# Altium footprint library MODULE.PcbLib: 33 footprints (part 2 of 3)
Each footprint in its own frame and in the unit in brackets; x right, y up, seen from the top. Pads: shape width x height; smd on the part's side, far side on the other; paste and mask are expansions set on the pad; w line width, h text height; cw(c..) or ccw(c..) is an arc to the next point about the centre after c.
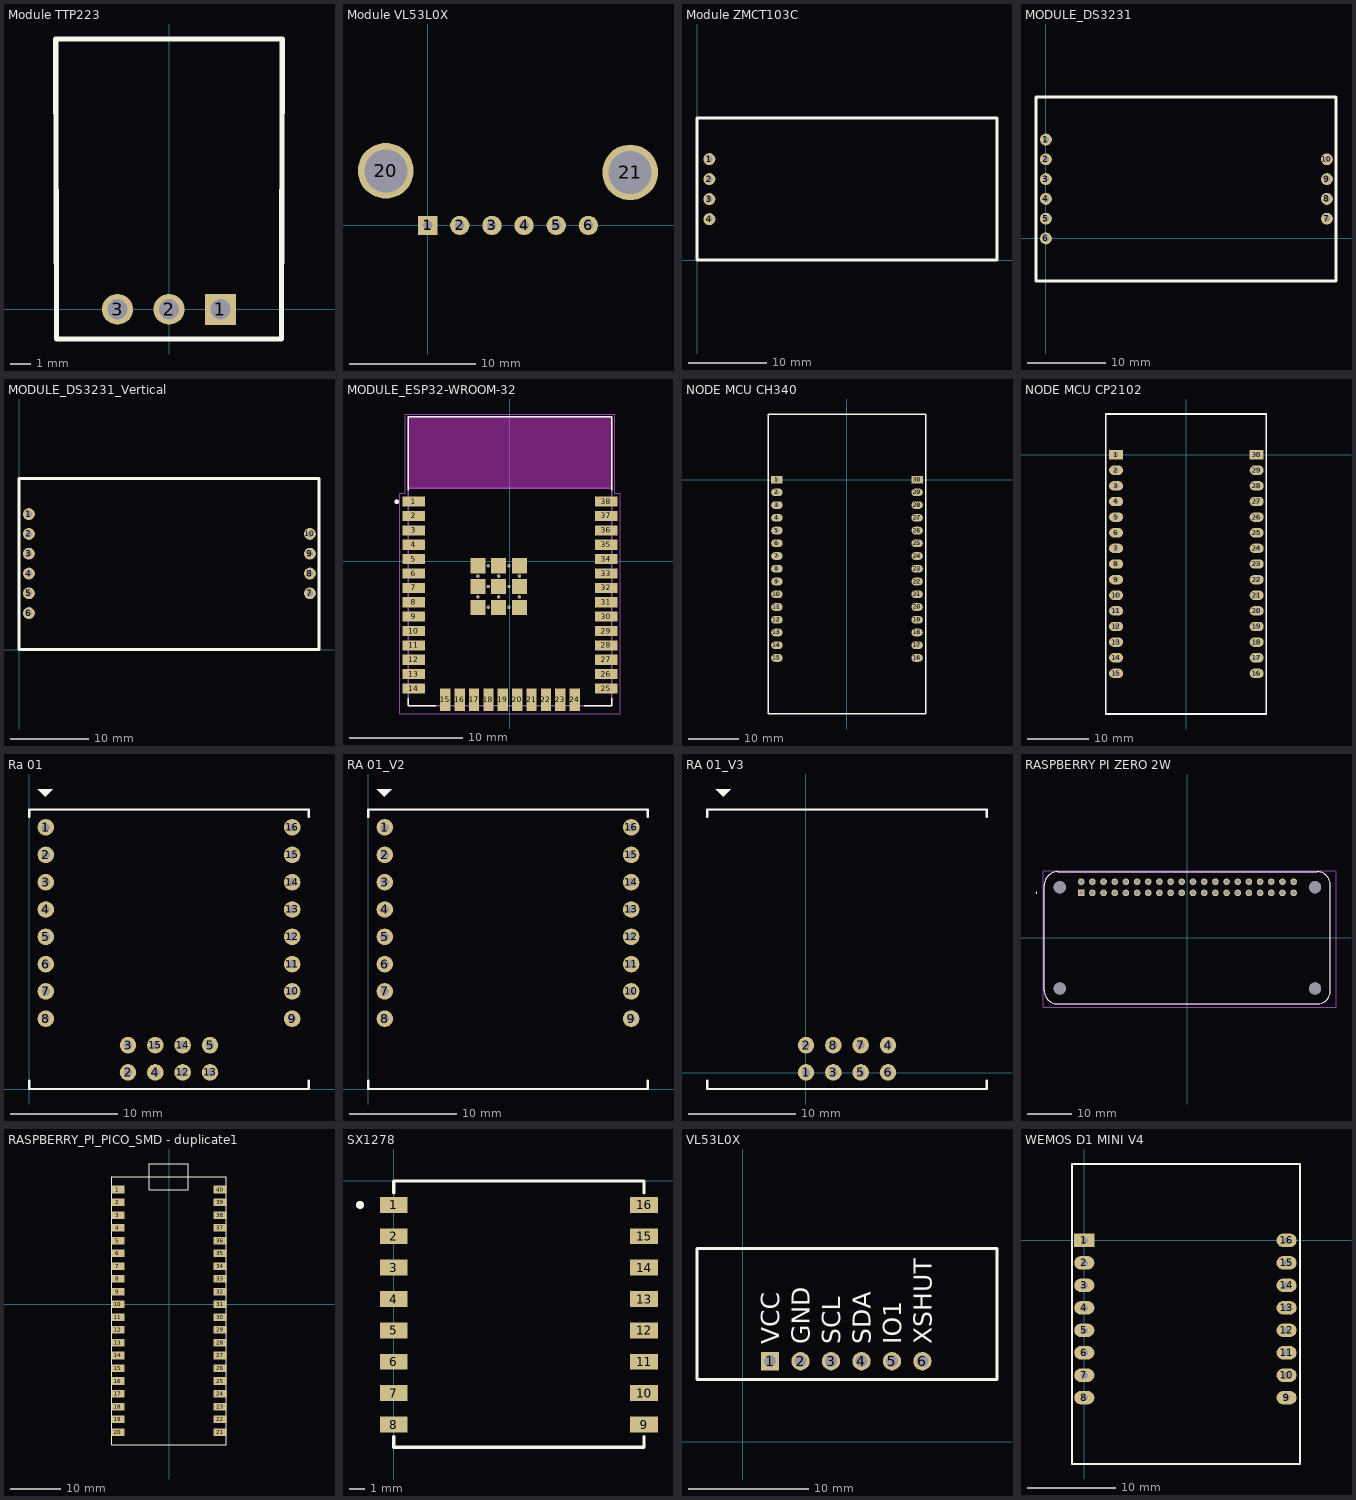
[diagram p1: the footprints below, top view; thin cyan lines are the x and y axes]

## Module TTP223 [mil]
pads (3):
  rect 60x60 hole 39.37: 1(100,0)
  round 60 hole 39.37: 2(0,0) 3(-100,0)
Top Overlay:
  lines w10: -220,525 220,525 218.23,-57.67 -218.23,-57.67 -220,525
3D body "touch button TTP223.SLDPRT": height 39.37, standoff -39.37, extent -206.69,-45.43 206.69,525.43

## Module VL53L0X [mil] "Module VL53L0X"
pads (8):
  rect 60x60 hole 30: 1(0,0)
  round 60 hole 30: 2(100,0) 3(200,0) 4(300,0) 5(400,0) 6(500,0)
  round 173.23 hole 133.86: 20(-130,170) 21(630,165)
3D body "VL53L0X_TOF.step": height 39.37, standoff -110.24, extent -245.58,-44.57 745.58,384.57

## Module ZMCT103C [mil] "Current Sensor 5A AC – 1 phaseplpl"
pads (4):
  round 60 hole 30: 1(60.63,504.33) 2(60.63,404.33) 3(60.63,304.33) 4(60.63,204.33)
Top Overlay:
  lines w15: -1.06,710 1495,710 ; 0,708.66 0,0 1495,0 ; 1496.06,0 1496.06,708.66
3D body "1x4.STEP": height 354.33, standoff -340.16, extent 10,155 110,555

## MODULE_DS3231 [mil]
pads (10):
  round 60 hole 30: 1(0,500) 2(0,400) 3(0,300) 4(0,200) 5(0,100) 6(0,0) 7(1420,100) 8(1420,200) 9(1420,300) 10(1420,400)
Top Overlay:
  lines w15: -50,-215 -50,715 1465.75,715 1465.75,-215 -50,-215
3D body "DS3231 RTC.step": height 1586.61, standoff -175.2, extent -12.2,-198.82 520.47,698.82

## MODULE_DS3231_Vertical [mil]
pads (10):
  round 60 hole 30: 1(50,685) 2(50,585) 3(50,485) 4(50,385) 5(50,285) 6(50,185) 7(1470,285) 8(1470,385) 9(1470,485) 10(1470,585)
Top Overlay:
  lines w15: 0,0 1515.75,0 1515.75,866.14 0,866.14 0,0
3D body "2.54 mm crooked Male Header Dupont Pins, 90°, 1X4 v1.step": height 168.11, standoff -122.83, extent 1167.32,235 1482.68,635
3D body "DS3231 RTC.step": height 1828.74, standoff 66.93, extent 919.53,-13.82 1452.2,883.82

## MODULE_ESP32-WROOM-32 [mm]
height 3.2
pads (59):
  rect 2x0.9 smd: 1(-8.5,5.26) 2(-8.5,3.99) 3(-8.5,2.72) 4(-8.5,1.45) 5(-8.5,0.18) 6(-8.5,-1.09) 7(-8.5,-2.36) 8(-8.5,-3.63) 9(-8.5,-4.9) 10(-8.5,-6.17) 11(-8.5,-7.44) 12(-8.5,-8.71) 13(-8.5,-9.98) 14(-8.5,-11.25) 25(8.5,-11.25) 26(8.5,-9.98) 27(8.5,-8.71) 28(8.5,-7.44) 29(8.5,-6.17) 30(8.5,-4.9) 31(8.5,-3.63) 32(8.5,-2.36) 33(8.5,-1.09) 34(8.5,0.18) 35(8.5,1.45) 36(8.5,2.72) 37(8.5,3.99) 38(8.5,5.26)
  rect 0.9x2 smd: 15(-5.715,-12.25) 16(-4.445,-12.25) 17(-3.175,-12.25) 18(-1.905,-12.25) 19(-0.635,-12.25) 20(0.635,-12.25) 21(1.905,-12.25) 22(3.175,-12.25) 23(4.445,-12.25) 24(5.715,-12.25)
  rect 1.33x1.33 smd: 39_1(-2.835,-0.405) 39_2(-1,-0.405) 39_3(0.835,-0.405) 39_4(-2.835,-2.24) 39_5(-1,-2.24) 39_6(0.835,-2.24) 39_7(-2.835,-4.075) 39_8(-1,-4.075) 39_9(0.835,-4.075)
  round 0.3 hole 0.2: 39_10(-1.917,-0.405) 39_11(-0.082,-0.405) 39_12(-2.835,-1.322) 39_13(-1,-1.322) 39_14(0.835,-1.322) 39_15(-1.917,-2.24) 39_16(-0.082,-2.24) 39_17(-2.835,-3.157) 39_18(-1,-3.157) 39_19(0.835,-3.157) 39_20(-1.917,-4.075) 39_21(-0.082,-4.075)
Top Overlay:
  circle w0.2: c-10,5.25 r0.1
  lines w0.127: -9,-12.1 -9,-12.75 -6.55,-12.75 ; -9,6.25 -9,12.75 9,12.75 9,6.25 ; 6.55,-12.75 9,-12.75 9,-12.1
Keep-Out Layer:
  region: 9,6.45 -9,6.45 -9,12.75 9,12.75
  region: 9,6.45 -9,6.45 -9,12.75 9,12.75
Mechanical 13:
  circle w0.2: c-10,5.25 r0.1
  lines w0.127: -9,6.45 -9,-12.75 9,-12.75 9,6.45 ; -9,6.45 -9,12.75 9,12.75 9,6.45 ; -9,6.45 9,6.45
  text "ANTENNA" at -6,9 h1.78
Mechanical 15:
  lines w0.05: -9.75,-13.5 9.75,-13.5 9.75,6 9.25,6 9.25,13 -9.25,13 -9.25,6 -9.75,6 -9.75,-13.5
3D body "step_temp.STEP": height 3.2, standoff 0, extent -9,-12.75 9,12.75

## NODE MCU CH340 [mil]
pads (30):
  rect 90x60 hole 31: 1(-550,0) 30(550,0)
  oval 90x60 hole 31: 2(-550,-100) 3(-550,-200) 4(-550,-300) 5(-550,-400) 6(-550,-500) 7(-550,-600) 8(-550,-700) 9(-550,-800) 10(-550,-900) 11(-550,-1000) 12(-550,-1100) 13(-550,-1200) 14(-550,-1300) 15(-550,-1400) 16(550,-1400) 17(550,-1300) 18(550,-1200) 19(550,-1100) 20(550,-1000) 21(550,-900) 22(550,-800) 23(550,-700) 24(550,-600) 25(550,-500) 26(550,-400) 27(550,-300) 28(550,-200) 29(550,-100)
Top Overlay:
  lines w10: -620,-1840 -620,515 620,515 620,-1840 -620,-1840
3D body "Lolin NodeMCU ESP8266 V3.STEP": height 299.21, standoff -218.11, extent -625,-1845.71 615.16,515.71

## NODE MCU CP2102 [mil]
pads (30):
  rect 90x60 hole 31: 1(-450,0) 30(450,0)
  oval 90x60 hole 31: 2(-450,-100) 3(-450,-200) 4(-450,-300) 5(-450,-400) 6(-450,-500) 7(-450,-600) 8(-450,-700) 9(-450,-800) 10(-450,-900) 11(-450,-1000) 12(-450,-1100) 13(-450,-1200) 14(-450,-1300) 15(-450,-1400) 16(450,-1400) 17(450,-1300) 18(450,-1200) 19(450,-1100) 20(450,-1000) 21(450,-900) 22(450,-800) 23(450,-700) 24(450,-600) 25(450,-500) 26(450,-400) 27(450,-300) 28(450,-200) 29(450,-100)
Top Overlay:
  lines w10: -515,-1660 510,-1660 510,260 -515,260 -515,-1660
3D body "+++ ESP8266 NodeMCU Board +++.stp": height 276.72, standoff -212.6, extent -505.71,-1655 505.71,253.86

## Ra 01 [mm] "SX1278 Lora Ra-01 AI-Thinker Mạch Thu Phát RF 433MHz 10Km-DIP"
pads (24):
  round 1.54 hole 0.752: 1(1.54,24.345) 2(1.54,21.78) 2(9.19,1.54) 3(1.54,19.24) 3(9.19,4.08) 4(1.54,16.7) 4(11.73,1.54) 5(1.54,14.16) 5(16.817,4.08) 6(1.54,11.62) 7(1.54,9.08) 8(1.54,6.54) 9(24.46,6.54) 10(24.46,9.08) 11(24.46,11.62) 12(14.277,1.54) 12(24.46,14.16) 13(16.817,1.54) 13(24.46,16.7) 14(14.277,4.08) 14(24.46,19.24) 15(11.73,4.08) 15(24.46,21.78) 16(24.469,24.345)
Top Overlay:
  region: 0.794,27.908 2.191,27.908 1.492,27.21
  lines w0.203: 0,0.762 0,0 26,0 26,0.762 ; 0,25.314 0,26 26,26 26,25.314
Bottom Solder:
  lines w0.127: 0,0 0,26 ; 26,0 26,26 ; 26.006,0 26.006,26
Mechanical 1:
  lines w0.127: 0,0 26,0 ; 0,26 26,26
3D body "zl262-8s_p2-54_l20-8_w2-54_h8-5.stp": height 8.5, standoff -3, extent 0.346,5.084 2.886,25.904
3D body "2x4 Femaile Header v2.step": height 7.5, standoff -3.75, extent 7.796,0.307 18.296,5.207
3D body "zl262-8s_p2-54_l20-8_w2-54_h8-5.stp": height 3, standoff -8.5, extent 23.206,5.084 25.746,25.904

## RA 01_V2 [mm]
pads (16):
  round 1.54 hole 0.752: 1(1.54,24.345) 2(1.54,21.78) 3(1.54,19.24) 4(1.54,16.7) 5(1.54,14.16) 6(1.54,11.62) 7(1.54,9.08) 8(1.54,6.54) 9(24.46,6.54) 10(24.46,9.08) 11(24.46,11.62) 12(24.46,14.16) 13(24.46,16.7) 14(24.46,19.24) 15(24.46,21.78) 16(24.469,24.345)
Top Overlay:
  region: 0.794,27.908 2.191,27.908 1.492,27.21
  lines w0.203: 0,0.762 0,0 26,0 26,0.762 ; 0,25.314 0,26 26,26 26,25.314
Bottom Solder:
  lines w0.127: 0,0 0,26 ; 26,0 26,26 ; 26.006,0 26.006,26
Mechanical 1:
  lines w0.127: 0,0 26,0 ; 0,26 26,26
3D body "zl262-8s_p2-54_l20-8_w2-54_h8-5.stp": height 3, standoff -8.5, extent 23.206,5.084 25.746,25.904
3D body "zl262-8s_p2-54_l20-8_w2-54_h8-5.stp": height 8.5, standoff -3, extent 0.346,5.084 2.886,25.904

## RA 01_V3 [mm]
pads (8):
  round 1.54 hole 0.752: 1(0.046,0.016) 2(0.046,2.556) 3(2.586,0.016) 4(7.673,2.556) 5(5.133,0.016) 6(7.673,0.016) 7(5.133,2.556) 8(2.586,2.556)
Top Overlay:
  region: -8.35,26.384 -6.953,26.384 -7.652,25.686
  lines w0.203: -9.144,-0.762 -9.144,-1.524 16.856,-1.524 16.856,-0.762 ; -9.144,23.79 -9.144,24.476 16.856,24.476 16.856,23.79
Bottom Solder:
  lines w0.127: -9.144,-1.524 -9.144,24.476 ; 16.856,-1.524 16.856,24.476 ; 16.862,-1.524 16.862,24.476
Mechanical 1:
  lines w0.127: -9.144,-1.524 16.856,-1.524 ; -9.144,24.476 16.856,24.476
3D body "2x4 Femaile Header v2.step": height 7.5, standoff -3.75, extent -1.348,-1.217 9.152,3.683

## RASPBERRY PI ZERO 2W [mm]
pads (44):
  rect 1.508x1.508 / inner round 1.508 / far side rect 1.508x1.508 hole 1: 1(-24.13,10.23)
  round 1.508 hole 1: 2(-24.13,12.77) 3(-21.59,10.23) 4(-21.59,12.77) 5(-19.05,10.23) 6(-19.05,12.77) 7(-16.51,10.23) 8(-16.51,12.77) 9(-13.97,10.23) 10(-13.97,12.77) 11(-11.43,10.23) 12(-11.43,12.77) 13(-8.89,10.23) 14(-8.89,12.77) 15(-6.35,10.23) 16(-6.35,12.77) 17(-3.81,10.23) 18(-3.81,12.77) 19(-1.27,10.23) 20(-1.27,12.77) 21(1.27,10.23) 22(1.27,12.77) 23(3.81,10.23) 24(3.81,12.77) 25(6.35,10.23) 26(6.35,12.77) 27(8.89,10.23) 28(8.89,12.77) 29(11.43,10.23) 30(11.43,12.77) 31(13.97,10.23) 32(13.97,12.77) 33(16.51,10.23) 34(16.51,12.77) 35(19.05,10.23) 36(19.05,12.77) 37(21.59,10.23) 38(21.59,12.77) 39(24.13,10.23) 40(24.13,12.77)
  round 2.75 hole 2.75 unplated: ""(-29,-11.5) ""(-29,11.5) ""(29,-11.5) ""(29,11.5)
Top Overlay:
  circle w0.2: c-34.29,10.23 r0.1
  lines w0.127: 4.4,-15 12.75,-15 ; 17,-15 25.35,-15 ; -32.5,-12 ccw(c-29.5,-12) -29.5,-15 29.5,-15 ccw(c29.5,-12) 32.5,-12 32.5,12 ccw(c29.5,12) 29.5,15 -29.5,15 ccw(c-29.5,12) -32.5,12 -32.5,-12
Mechanical 13:
  circle w0.2: c-34.29,10.23 r0.1
  lines w0.127: 4.4,-15 12.75,-15 ; 17,-15 25.35,-15 ; -32.5,-12 ccw(c-29.5,-12) -29.5,-15 29.5,-15 ccw(c29.5,-12) 32.5,-12 32.5,12 ccw(c29.5,12) 29.5,15 -29.5,15 ccw(c-29.5,12) -32.5,12 -32.5,-12
Mechanical 15:
  lines w0.05: -32.75,-15.75 33.75,-15.75 33.75,15.25 -32.75,15.25 -32.75,-15.75
3D body "step_temp.STEP": height 5.57, standoff -0.04, extent -32.5,-16 33.5,15

## RASPBERRY_PI_PICO_SMD - duplicate1 [mil]
pads (40):
  rect 100x59.37 smd: 1(-400,900) 2(-400,800) 3(-400,700) 4(-400,600) 5(-400,500) 6(-400,400) 7(-400,300) 8(-400,200) 9(-400,100) 10(-400,0) 11(-400,-100) 12(-400,-200) 13(-400,-300) 14(-400,-400) 15(-400,-500) 16(-400,-600) 17(-400,-700) 18(-400,-800) 19(-400,-900) 20(-400,-1000) 21(400,-1000) 22(400,-900) 23(400,-800) 24(400,-700) 25(400,-600) 26(400,-500) 27(400,-400) 28(400,-300) 29(400,-200) 30(400,-100) 31(400,0) 32(400,100) 33(400,200) 34(400,300) 35(400,400) 36(400,500) 37(400,600) 38(400,700) 39(400,800) 40(400,900)
Top Overlay:
  lines w6: -450,-1100 -450,1000 450,1000 450,-1100 -450,-1100 ; -153.28,900 -153.28,1100 150,1100 150,900 -153.28,900
3D body "step_temp.STEP": height 146.85, standoff 0, extent -413.39,-1048.94 413.39,1010.12

## SX1278 [mil]
pads (16):
  rect 70x40 smd: 1(0,-60) 2(0,-139) 3(0,-218) 4(0,-297) 5(0,-376) 6(0,-455) 7(0,-534) 8(0,-613) 9(630,-613) 10(630,-534) 11(630,-455) 12(630,-376) 13(630,-297) 14(630,-218) 15(630,-139) 16(630,-60)
Top Overlay:
  circle w10: c-85,-60 r5
  lines w8: 0,-643 0,-670 630,-670 630,-643 ; 0,-30 0,0 630,0 630,-30
Bottom Solder:
  lines w5: -0.23,-670 -0.23,0.54 ; 0,-670 0,0 ; 630,-670 630,0
Mechanical 1:
  lines w5: 0,-670 630,-670 ; 0,0 630,0

## VL53L0X [mil]
pads (6):
  rect 60x60 hole 39.37: 1(90,265)
  round 60 hole 39.37: 2(190,265) 3(290,265) 4(390,265) 5(490,265) 6(590,265)
Top Overlay:
  lines w10: -150,205 -150,635 835,635 835,205 -150,205
  text "XSHUT" at 620,320 h60
  text "IO1" at 520,320 h60
  text "SDA" at 420,320 h60
  text "SCL" at 320,320 h60
  text "GND" at 220,320 h60
  text "VCC" at 120,320 h60
3D body "vl53l0x.STEP": height 207.09, standoff -237.8, extent -146.66,203.46 836.66,636.54

## WEMOS D1 MINI V4 [mil]
pads (16):
  rect 90x60 hole 31: 1(0,0)
  oval 90x60 hole 31: 2(0,-100) 3(0,-200) 4(0,-300) 5(0,-400) 6(0,-500) 7(0,-600) 8(0,-700) 9(900,-700) 10(900,-600) 11(900,-500) 12(900,-400) 13(900,-300) 14(900,-200) 15(900,-100) 16(900,0)
Top Overlay:
  lines w10: -55,-995 -55,340 960,340 960,-995 -55,-995
3D body "wemos d1 mini V4.STEP": height 169.99, standoff 6.61, extent -46.97,-991.42 956.97,333.39